# Altium footprint library IDETEC.PcbLib: 275 footprints (part 12 of 18)
Each footprint in its own frame and in the unit in brackets; x right, y up, seen from the top. Pads: shape width x height; smd on the part's side, far side on the other; paste and mask are expansions set on the pad; w line width, h text height; cw(c..) or ccw(c..) is an arc to the next point about the centre after c.
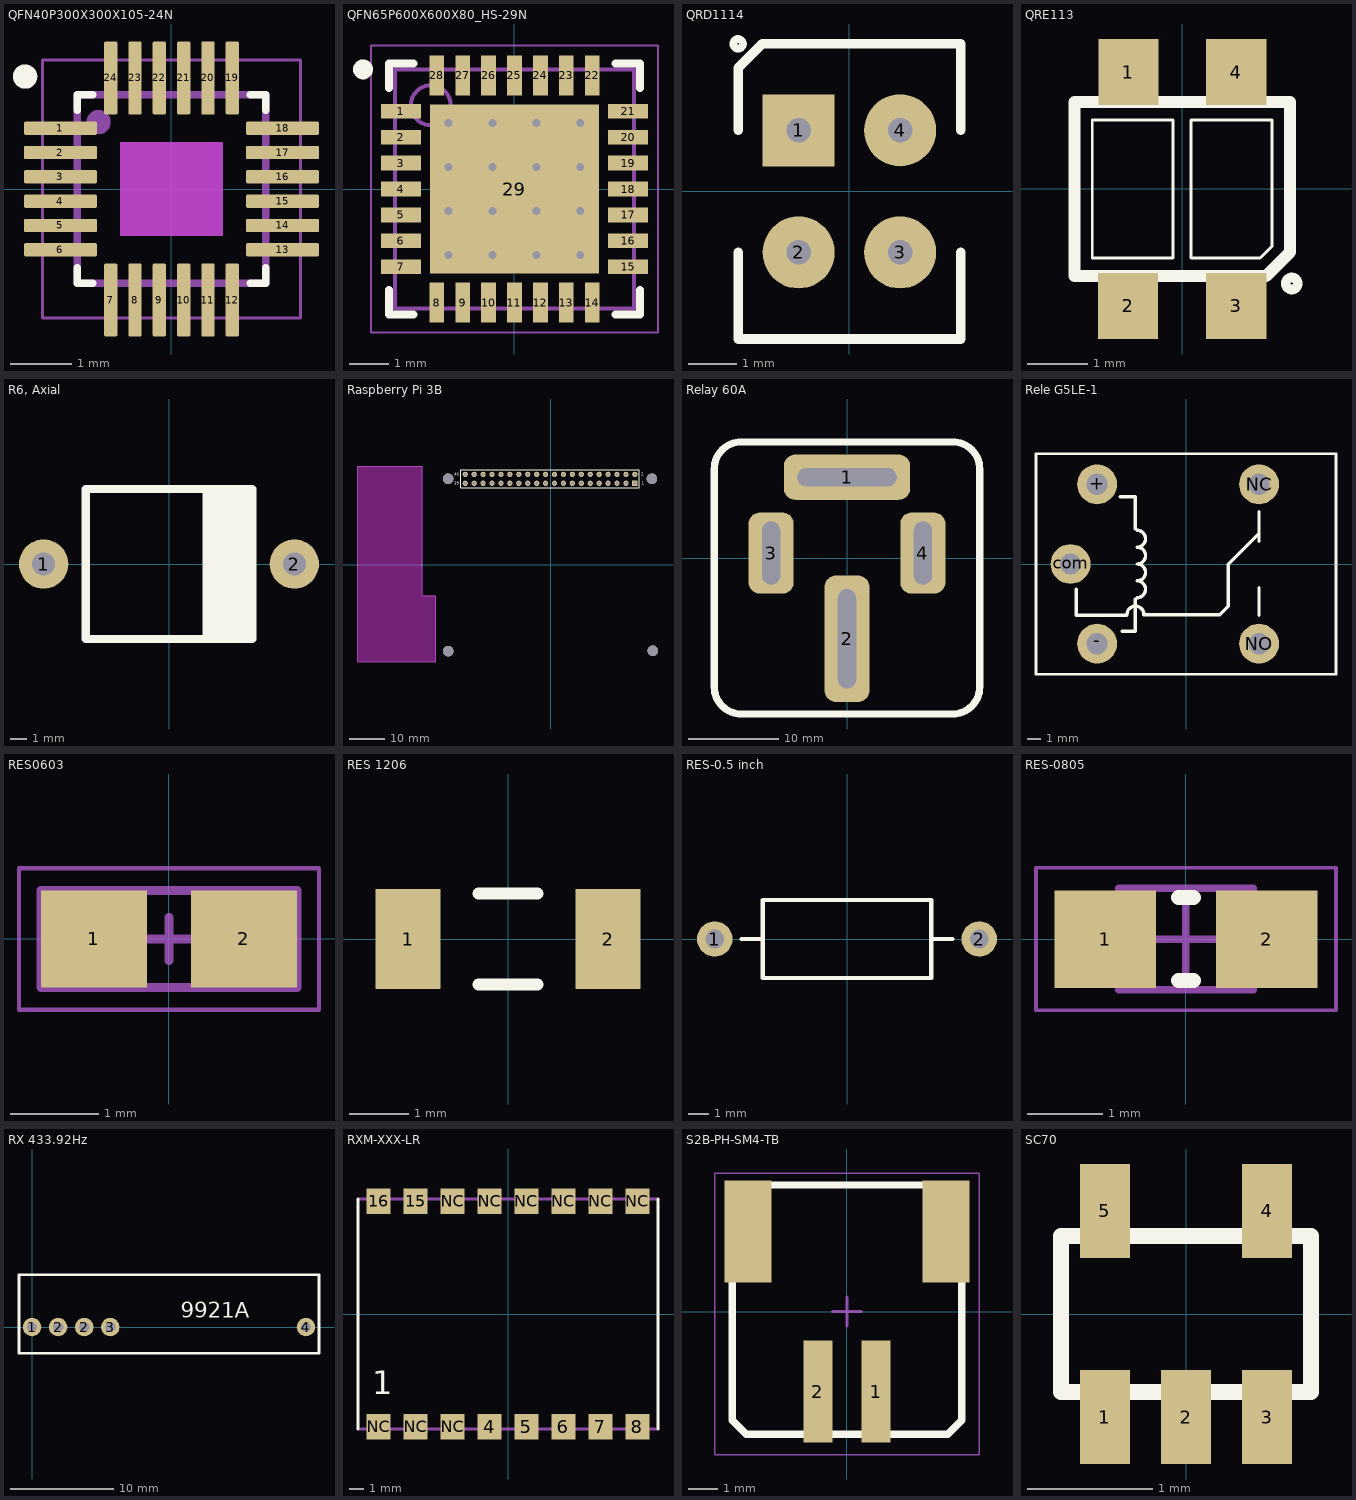
[diagram p11: the footprints below, top view; thin cyan lines are the x and y axes]

## QFN40P300X300X105-24N [mm]
pads (24):
  rrect25% 1.2x0.22 smd: 1(-1.825,1) 2(-1.825,0.6) 3(-1.825,0.2) 4(-1.825,-0.2) 5(-1.825,-0.6) 6(-1.825,-1) 13(1.825,-1) 14(1.825,-0.6) 15(1.825,-0.2) 16(1.825,0.2) 17(1.825,0.6) 18(1.825,0.999)
  rrect25% 0.22x1.2 smd: 7(-1,-1.825) 8(-0.6,-1.825) 9(-0.2,-1.825) 10(0.2,-1.825) 11(0.6,-1.825) 12(1,-1.825) 19(1,1.825) 20(0.6,1.825) 21(0.2,1.825) 22(-0.2,1.825) 23(-0.6,1.825) 24(-1,1.825)
Top Overlay:
  circle w0.2: c-2.407,1.849 r0.1
  lines w0.127: -1.55,-1.3 -1.55,-1.55 -1.3,-1.55 ; -1.55,1.3 -1.55,1.55 -1.3,1.55 ; 1.3,-1.55 1.55,-1.55 1.55,-1.3 ; 1.3,1.55 1.55,1.55 1.55,1.3
Mechanical 8 keep-out:
  rectangle: -0.85,-0.77 0.85,0.77
Mechanical 10:
  rectangle: -0.85,-0.77 0.85,0.77
Mechanical 16:
  circle w0.2: c-1.2,1.1 r0.1
  lines w0.127: -1.55,-1.55 1.55,-1.55 1.55,1.55 -1.55,1.55 -1.55,-1.55
Mechanical 27:
  lines w0.05: -2.12,-2.12 2.12,-2.12 2.12,2.12 -2.12,2.12 -2.12,-2.12
3D body "User Library-24 QFN 3x3.step": height 0.98, standoff -0.02, extent -1.501,-1.5 1.499,1.5

## QFN65P600X600X80_HS-29N [mm] "QFN, 28-Leads, Body 6,00x6,00mm, Pitch 0,65mm, Thermal Pad 4,25x4,25mm, IPC Medium Density"
height 0.8
pads (29):
  rect 1x0.37 smd: 1(-2.85,1.95) 2(-2.85,1.3) 3(-2.85,0.65) 4(-2.85,0) 5(-2.85,-0.65) 6(-2.85,-1.3) 7(-2.85,-1.95) 15(2.85,-1.95) 16(2.85,-1.3) 17(2.85,-0.65) 18(2.85,0) 19(2.85,0.65) 20(2.85,1.3) 21(2.85,1.95)
  rect 0.37x1 smd: 8(-1.95,-2.85) 9(-1.3,-2.85) 10(-0.65,-2.85) 11(0,-2.85) 12(0.65,-2.85) 13(1.3,-2.85) 14(1.95,-2.85) 22(1.95,2.85) 23(1.3,2.85) 24(0.65,2.85) 25(0,2.85) 26(-0.65,2.85) 27(-1.3,2.85) 28(-1.95,2.85)
  rect 4.25x4.25 smd: 29(0,0)
via -1.65,1.65 diameter 0.5 hole 0.2
via 1.65,1.65 diameter 0.5 hole 0.2
via 1.65,-1.65 diameter 0.5 hole 0.2
via 0.55,-1.65 diameter 0.5 hole 0.2
via -0.55,-1.65 diameter 0.5 hole 0.2
via -1.65,-1.65 diameter 0.5 hole 0.2
via 1.65,-0.55 diameter 0.5 hole 0.2
via 0.55,-0.55 diameter 0.5 hole 0.2
via -0.55,-0.55 diameter 0.5 hole 0.2
via -1.65,-0.55 diameter 0.5 hole 0.2
via 1.65,0.55 diameter 0.5 hole 0.2
via 0.55,0.55 diameter 0.5 hole 0.2
via -0.55,0.55 diameter 0.5 hole 0.2
via -1.65,0.55 diameter 0.5 hole 0.2
via 0.55,1.65 diameter 0.5 hole 0.2
via -0.55,1.65 diameter 0.5 hole 0.2
Top Overlay:
  circle w0.25: c-3.8,3 r0.125
  lines w0.2: -3.15,-2.535 -3.15,-3.15 -2.535,-3.15 ; -3.15,2.535 -3.15,3.15 -2.535,3.15 ; 2.535,-3.15 3.15,-3.15 3.15,-2.535 ; 2.535,3.15 3.15,3.15 3.15,2.535
Mechanical 13:
  circle w0.1: c-2.1,2.1 r0.5
  lines w0.1: -3,-3 3,-3 3,3 -3,3 -3,-3
Mechanical 15:
  lines w0.05: -3.6,-3.6 3.6,-3.6 3.6,3.6 -3.6,3.6 -3.6,-3.6
  lines w0.1: -0.5,0 0.5,0 ; 0,-0.5 0,0.5
3D body "SW3dPS-QFN-28.STEP": height 1.02, standoff -0.08, extent -3,-3 3,3

## QRD1114 [mm] "QRD1114 reflective sensors, phototransistor responds  to radiation emitted from the diode only when a reflective  object or surface is"
pads (4):
  rect 1.5x1.5 hole 0.51: 1(-1.055,1.27)
  round 1.5 hole 0.51: 2(-1.055,-1.27) 3(1.055,-1.27) 4(1.055,1.27)
Top Overlay:
  circle w0.16: c-2.315,3.07 r0.1
  lines w0.2: -2.315,-1.27 -2.315,-3.07 2.315,-3.07 ; -2.315,1.27 -2.315,2.57 -1.815,3.07 2.315,3.07 2.315,1.27 ; 2.315,-3.04 2.315,-1.27
3D body "User Library-QRD1113-4.STEP": height 4.7, standoff -4.95, extent -2.195,-3.05 2.195,3.05

## QRE113 [mm] "Minature Reflective Object Sensor"
pads (4):
  rect 1x1.1 smd: 1(-0.9,1.95) 2(-0.9,-1.95) 3(0.9,-1.95) 4(0.9,1.95)
Top Overlay:
  circle w0.16: c1.825,-1.575 r0.1
  lines w0.05: -1.5,-1.15 -0.15,-1.15 -0.15,1.15 -1.5,1.15 -1.5,-1.15 ; 0.15,-1.15 0.15,1.15 1.5,1.15 1.5,-0.95 1.3,-1.15 0.15,-1.15
  lines w0.2: -1.8,-1.45 -1.8,1.45 1.8,1.45 1.8,-1.05 1.4,-1.45 -1.8,-1.45
3D body "FINAL STEP PIN QRE.step": height 0.73, standoff 0, extent 0.59,1.3 1.2,2.4
3D body "FINAL STEP PIN QRE.step": height 0.73, standoff 0, extent -1.2,1.3 -0.59,2.4
3D body "FINAL STEP PIN QRE.step": height 0.7, standoff -0.03, extent 0.59,-2.4 1.2,-1.3
3D body "FINAL STEP PIN QRE.step": height 0.7, standoff -0.03, extent -1.2,-2.4 -0.59,-1.3
3D body "FINAL STEP QRE.step": height 1.6, standoff 0, extent -1.75,-1.4 1.75,1.4

## R6, Axial [mm] "DIODE GEN PURP 1KV 6A R6"
height 10
pads (2):
  round 3 hole 1.4: 1(-7.62,0) 2(7.62,0)
Top Overlay:
  lines w0.5: -5.064,4.56 -5.064,-4.56 5.064,-4.56 5.064,4.56 ; -5.064,4.57 5.064,4.57 ; 2.286,-4.55 2.286,4.57 ; 2.786,-4.56 2.786,4.56 ; 3.276,-4.56 3.276,4.56 ; 3.775,-4.56 3.775,4.56 ; 4.273,-4.56 4.273,4.56 ; 4.732,-4.56 4.732,4.56
3D body "User Library-Diode R-6 diameter 9_1 pitch 600mils.STEP": height 9.56, standoff -5.15, extent -8.27,-4.56 8.27,4.56

## Raspberry Pi 3B [mm]
pads (44):
  rect 1.5x1.5 hole 0.9: 1(23.916,23.23)
  round 1.5 hole 0.9: 2(23.916,25.77) 3(21.376,23.23) 4(21.376,25.77) 5(18.836,23.23) 6(18.836,25.77) 7(16.296,23.23) 8(16.296,25.77) 9(13.756,23.23) 10(13.756,25.77) 11(11.216,23.23) 12(11.216,25.77) 13(8.676,23.23) 14(8.676,25.77) 15(6.136,23.23) 16(6.136,25.77) 17(3.596,23.23) 18(3.596,25.77) 19(1.056,23.23) 20(1.056,25.77) 21(-1.484,23.23) 22(-1.484,25.77) 23(-4.024,23.23) 24(-4.024,25.77) 25(-6.564,23.23) 26(-6.564,25.77) 27(-9.104,23.23) 28(-9.104,25.77) 29(-11.644,23.23) 30(-11.644,25.77) 31(-14.184,23.23) 32(-14.184,25.77) 33(-16.724,23.23) 34(-16.724,25.77) 35(-19.264,23.23) 36(-19.264,25.77) 37(-21.804,23.23) 38(-21.804,25.77) 39(-24.344,23.23) 40(-24.344,25.77)
  round 3 hole 3 unplated: ""(-29.214,-24.5) ""(-29.214,24.5) ""(28.786,24.5) ""(29,-24.391)
Top Overlay:
  lines w0.2: -25.614,21.96 25.186,21.96 25.186,27.04 -25.614,27.04 -25.614,21.96
  text "1" at 25.807,22.88 h0.8
  text "2" at 25.688,25.426 h0.8
  text "40" at -27.476,25.426 h0.8
  text "39" at -27.476,22.88 h0.8
Keep-Out Layer:
  board cut-out: -54.861,-27.483 -32.711,-27.483 -32.699,-27.471 -32.699,-8.739 -36.532,-8.739 -36.532,28.02 -54.861,28.02
Mechanical 1:
  lines w0.3: -32.711,-27.483 -54.861,-27.483 -54.861,28.02 -36.532,28.02 -36.532,-8.739 -32.699,-8.739 -32.699,-27.471
3D body "User Library-Raspberry Pi 3.STEP": height 14.85, standoff -4.49, extent -55.117,-29.196 32.255,28.115
3D body "User Library-ZL262-3SG.STEP": height 8.4, standoff -3.15, extent 17.566,24.54 25.186,27.04
3D body "User Library-ZL262-3SG.STEP": height 8.4, standoff -3.15, extent 9.946,24.54 17.566,27.04
3D body "User Library-ZL262-3SG.STEP": height 8.4, standoff -3.15, extent 2.326,24.54 9.946,27.04
3D body "User Library-ZL262-3SG.STEP": height 8.4, standoff -3.15, extent -5.294,24.54 2.326,27.04
3D body "User Library-ZL262-3SG.STEP": height 8.4, standoff -3.15, extent -12.914,24.54 -5.294,27.04
3D body "User Library-ZL262-3SG.STEP": height 8.4, standoff -3.15, extent -20.534,24.54 -12.914,27.04
3D body "User Library-ZL262-3SG.STEP": height 8.4, standoff -3.15, extent -25.614,24.54 -17.994,27.04
3D body "User Library-ZL262-3SG.STEP": height 8.4, standoff -3.15, extent -25.614,22 -17.994,24.5
3D body "User Library-ZL262-3SG.STEP": height 8.4, standoff -3.15, extent -20.534,22 -12.914,24.5
3D body "User Library-ZL262-3SG.STEP": height 8.4, standoff -3.15, extent -12.914,22 -5.294,24.5
3D body "User Library-ZL262-3SG.STEP": height 8.4, standoff -3.15, extent -5.294,22 2.326,24.5
3D body "User Library-ZL262-3SG.STEP": height 8.4, standoff -3.15, extent 2.326,22 9.946,24.5
3D body "User Library-ZL262-3SG.STEP": height 8.4, standoff -3.15, extent 9.946,22 17.566,24.5
3D body "User Library-ZL262-3SG.STEP": height 8.4, standoff -3.15, extent 17.566,22 25.186,24.5

## Relay 60A [mm] "relay 60A de Vehiculo"
height 8
pads (4):
  rrect50% 14x5 hole 2 slot 11 at 0 deg: 1(0,8.95)
  rrect50% 5x14 hole 2 slot 11 at 90 deg: 2(0,-8.95)
  rrect50% 5x9 hole 2 slot 7 at 90 deg: 3(-8.4,0.55) 4(8.4,0.55)
Top Overlay:
  lines w0.8: -14.704,-14.277 ccw(c-11.705,-14.277) -11.705,-17.277 11.705,-17.277 ccw(c11.705,-14.277) 14.704,-14.277 14.704,9.864 ccw(c11.705,9.864) 11.705,12.864 -11.705,12.864 ccw(c-11.705,9.864) -14.704,9.864 -14.704,-14.277
3D body "User Library-Relé Nagares RLP_4_12.STEP": height 48.87, standoff -7.93, extent -13.97,-14.823 13.53,16.177

## Rele G5LE-1 [mm] "OMRON G5LE-1"
pads (5):
  round 3 hole 1.6: +(-6.7,6) -(-6.7,-6) com(-8.7,0) NC(5.5,6) NO(5.5,-6)
Top Overlay:
  lines w0.2: -11.3,-8.3 -11.3,8.3 11.3,8.3 11.3,-8.3 -11.3,-8.3
  lines w0.254: -8.255,-1.905 -8.255,-3.85 -4.445,-3.85 ; -4.953,5.08 -3.81,5.08 -3.81,2.667 -3.683,2.54 cw(c-3.683,1.905) -3.683,1.27 cw(c-3.683,0.635) -3.683,0 cw(c-3.683,-0.635) -3.683,-1.27 cw(c-3.683,-1.905) -3.683,-2.54 -3.81,-2.667 -3.81,-5.08 -4.826,-5.08 ; -4.445,-3.81 cw(c-3.81,-3.81) -3.175,-3.81 2.54,-3.81 3.175,-3.175 3.175,-0.013 ; 3.187,-0.013 5.475,2.275 ; 5.5,-3.85 5.5,-1.775 ; 5.5,1.725 5.5,3.95
3D body "Rele OMRON G5LE-1.STEP": height 18.5, standoff -3.47, extent -11.25,-8.25 11.25,8.25

## RES0603 [mm] "Chip Resistor, 2-Leads, Body 2,90x1,10mm, IPC Medium Density"
height 0.7
pads (2):
  rect 1.2x1.1 smd: 1(-0.85,0) 2(0.85,0)
Mechanical 13:
  lines w0.1: -1.45,-0.55 -1.45,0.55 1.45,0.55 1.45,-0.55 -1.45,-0.55
Mechanical 15:
  lines w0.05: -1.699,-0.8 -1.699,0.8 1.701,0.8 1.701,-0.8 -1.699,-0.8
  lines w0.1: -0.243,0 0.244,0 ; 0,-0.244 0,0.243
3D body "User Library-RES_1609-0603.STEP": height 0.56, standoff 0, extent -0.85,-0.4 0.85,0.4

## RES 1206 [mm] "1206, 3.2mm x 1.6mm x 0.55mm, Lead (Pb)-Bearing Thick Film, Rectangular Chip Resistors"
height 0.55
pads (2):
  rect 1.1x1.7 smd: 1(-1.7,0) 2(1.7,0)
Top Overlay:
  lines w0.2: -0.5,-0.775 0.5,-0.775 ; -0.5,0.775 0.5,0.775
3D body "1206 Vishay CRCW RESISTOR.STEP": height 0.55, standoff 0, extent -1.6,-0.8 1.6,0.8

## RES-0.5 inch [mm] "Axial Device, Thru-Hole; 2 Leads; 0.5 in Pin Spacing"
height 2.032
pads (2):
  round 1.7 hole 0.9: 1(-6.35,0) 2(6.35,0)
Top Overlay:
  lines w0.2: -5.064,0 -4.048,0 ; 4.048,0 5.064,0 ; -4.048,-1.875 4.048,-1.875 4.048,1.875 -4.048,1.875 -4.048,-1.875
3D body "User Library-User Library-Half_watt_resistor_500spacing.STEP": height 4.38, standoff -2.07, extent -6.725,-1.875 6.725,1.875

## RES-0805 [mm] "Chip Resistor, 2-Leads, Body 2,00x1,25mm, IPC Medium Density"
height 0.7
pads (2):
  rect 1.35x1.3 smd: 1(-1.075,0) 2(1.075,0)
Top Overlay:
  lines w0.2: -0.1,-0.55 0.1,-0.55 ; -0.1,0.55 0.1,0.55
Mechanical 13:
  lines w0.1: -0.9,-0.675 0.9,-0.675 0.9,0.675 -0.9,0.675 -0.9,-0.675
Mechanical 15:
  lines w0.05: -2,-0.95 2,-0.95 2,0.95 -2,0.95 -2,-0.95
  lines w0.1: -0.5,0 0.5,0 ; 0,-0.5 0,0.5
3D body "User Library-RES_2013-0805.STEP": height 0.76, standoff 0, extent -1.15,-0.675 1.15,0.675

## RX 433.92Hz [mm] "RX 433.92Hz 9921A"
pads (5):
  round 1.8 hole 1: 1(0,0) 2(2.54,0) 2(5.08,0) 3(7.62,0) 4(26.67,0)
Top Overlay:
  lines w0.254: -1.27,-2.54 -1.27,0 -1.27,5.08 27.94,5.08 27.94,-2.54 -1.27,-2.54
  text "9921A" at 14.478,0.889 h1.52

## RXM-XXX-LR [mil]
pads (16):
  rect 65x70 smd: 4(-50,-305) 5(50,-305) 6(150,-305) 7(250,-305) 8(350,-305) 15(-250,305) 16(-350,305) NC(-350,-305) NC(-250,-305) NC(-150,-305) NC(-150,305) NC(-50,305) NC(50,305) NC(150,305) NC(250,305) NC(350,305)
Top Overlay:
  lines w8: -406,-311 -406,311 ; 406,-311 406,311
  text "1" at -367.91,-239.17 h108.5
Mechanical 16:
  lines w8: -406,-311 406,-311 ; -406,311 406,311
3D body "User Library-RXM-xxx-LR-1.STEP": height 130.31, standoff -0.39, extent -405.5,-315.35 405.52,315.36

## S2B-PH-SM4-TB [mm] "CONN HEADER PH SIDE 2POS 2MM SMD"
height 5.5
pads (4):
  rect 1x3.5 smd: 1(1,-2.75) 2(-1,-2.75)
  rect 1.6x3.5 smd: ""(-3.4,2.75) ""(3.4,2.75)
Top Overlay:
  lines w0.25: -3.938,-3.73 -3.938,4.346 3.938,4.346 3.938,-3.73 3.457,-4.211 -3.457,-4.211 -3.938,-3.73
Mechanical 15:
  lines w0.05: -4.54,-4.92 -4.54,4.751 4.54,4.751 4.54,-4.92 -4.54,-4.92
  lines w0.1: -0.5,0 0.5,0 ; 0,-0.5 0,0.5
3D body "S2B-PH-SM4-TB.STEP": height 5.58, standoff -0.02, extent -3.966,-4.045 3.934,4.555

## SC70 [mm] "SC70"
pads (5):
  rect 0.4x0.75 smd: 1(-0.65,-0.825) 2(0,-0.825) 3(0.65,-0.825) 4(0.65,0.825) 5(-0.65,0.825)
Top Overlay:
  lines w0.127: -1,-0.625 -1,0.625 1,0.625 1,-0.625 -1,-0.625
Top Paste:
  rectangle: 0.508,-1.168 0.838,-0.483
  rectangle: -0.165,-1.168 0.165,-0.483
  rectangle: -0.838,-1.168 -0.508,-0.483
  rectangle: 0.45,0.45 0.85,1.2
  rectangle: -0.85,0.45 -0.45,1.2
3D body "User Library-SC70-5-1.STEP": height 0.95, standoff 0, extent -1,-1.05 1,1.05